# Altium footprint library CRD25DA12N-FMC.PcbLib: 132 footprints (part 2 of 9)
Each footprint in its own frame and in the unit in brackets; x right, y up, seen from the top. Pads: shape width x height; smd on the part's side, far side on the other; paste and mask are expansions set on the pad; w line width, h text height; cw(c..) or ccw(c..) is an arc to the next point about the centre after c.
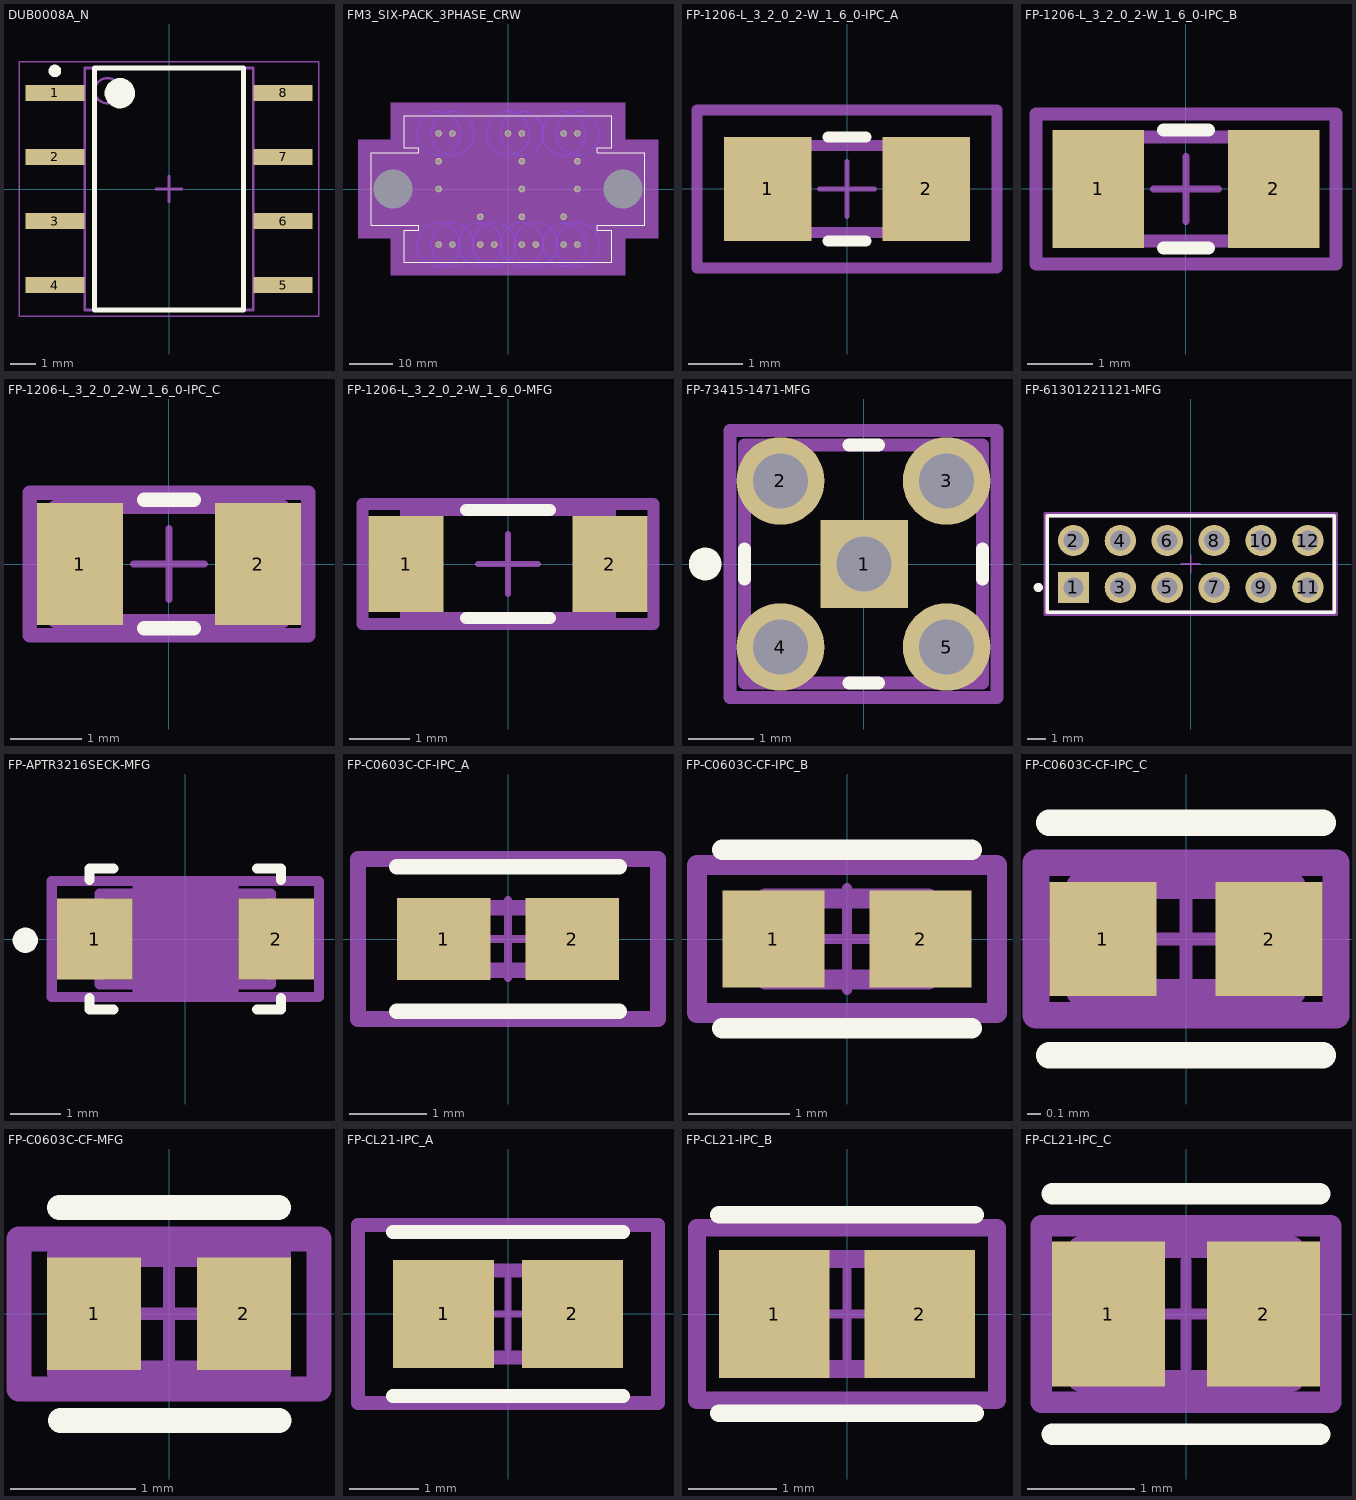
[diagram p1: the footprints below, top view; thin cyan lines are the x and y axes]

## DUB0008A_N [mm] "SOP, 8-Leads, Body 6.7x9.6mm, Pitch 2.54mm, IPC Medium Density"
height 4.85
pads (8):
  rrect15% 2.35x0.65 smd: 1(-4.525,3.81) 2(-4.525,1.27) 3(-4.525,-1.27) 4(-4.525,-3.81) 5(4.525,-3.81) 6(4.525,-1.27) 7(4.525,1.27) 8(4.525,3.81)
Top Overlay:
  circle w0.25: c-4.525,4.685 r0.125
  circle w0.6: c-1.95,3.8 r0.3
  lines w0.2: -2.95,-4.8 -2.95,4.8 2.95,4.8 2.95,-4.8 -2.95,-4.8
Mechanical 1:
  text ".Designator" at -2.54,-0.254 h1
Mechanical 13:
  circle w0.1: c-2.45,3.9 r0.5
  lines w0.1: -3.35,-4.8 -3.35,4.8 3.35,4.8 3.35,-4.8 -3.35,-4.8
Mechanical 15:
  lines w0.05: -5.95,-5.05 -5.95,5.05 5.95,5.05 5.95,-5.05 -5.95,-5.05
  lines w0.1: -0.5,0 0.5,0 ; 0,-0.5 0,0.5
3D body "DUB0008A.stp": height 4.85, standoff 0, extent -5.242,-4.75 5.242,4.75

## FM3_SIX-PACK_3PHASE_CRW [mm]
pads (25):
  round 1.524 hole 1.1: DC+_1(-6.4,-6.4) DC+_2(3.2,-6.4) DC+_3(12.8,-6.4) DC-1(-16,0) DC-2(3.2,0) DC-3(16,0) G1(-12.8,-12.8) G2(-16,12.8) G3(-3.2,-12.8) G4(3.2,12.8) G5(6.4,-12.8) G6(16,12.8) NTC1(12.8,-12.8) NTC2(16,-12.8) S1(-16,-12.8) S2(-12.8,12.8) S3(-6.4,-12.8) S4(0,12.8) S5(3.2,-12.8) S6(12.8,12.8) U(-16,6.4) V(3.2,6.4) W(16,6.4)
  round 0 hole 9 unplated: MH1(-26.5,0) MH2(26.5,0)
Bottom Layer keep-out:
  circle w0.254: c-16,12.8 r5
  circle w0.254: c-12.8,12.8 r5
  circle w0.254: c0,12.8 r5
  circle w0.254: c3.2,12.8 r5
  circle w0.254: c12.8,12.8 r5
  circle w0.254: c16,12.8 r5
  circle w0.254: c16,-12.8 r5
  circle w0.254: c12.997,-12.859 r5
  circle w0.254: c6.4,-12.8 r5
  circle w0.254: c3.2,-12.8 r5
  circle w0.254: c-3.2,-12.8 r5
  circle w0.254: c-6.4,-12.8 r5
  circle w0.254: c-12.8,-12.8 r5
  circle w0.254: c-16,-12.8 r5
Top Overlay:
  lines w0.152: -31.521,-8.331 -20.625,-8.331 -20.625,-9.563 -23.927,-9.563 -23.927,-16.878 23.927,-16.878 23.927,-9.563 20.625,-9.563 20.625,-8.331 31.521,-8.331 31.521,8.331 20.625,8.331 20.625,9.563 23.927,9.563 23.927,16.878 -23.927,16.878 -23.927,9.563 -20.625,9.563 -20.625,8.331 -31.521,8.331 -31.521,-8.331
Bottom Courtyard:
  text "Default Padstyle: EX60Y60D43P0" at -9.525,-21.831 h1.27
Bottom 3D Body:
  region: 26.975,19.926 -26.975,19.926 -26.975,11.379 -34.569,11.379 -34.569,-11.379 -26.975,-11.379 -26.975,-19.926 26.975,-19.926 26.975,-11.379 34.569,-11.379 34.569,11.379 26.975,11.379
Top Designator:
  text ".Designator" at 7.618,-0.694 h1.52
Mechanical 13:
  drawing of 27 lines, arcs and shapes, not listed
Mechanical 15:
  region: 20.752,-9.436 20.752,-8.458 31.648,-8.458 31.648,8.458 20.752,8.458 20.752,9.436 24.054,9.436 24.054,17.005 -24.054,17.005 -24.054,9.436 -20.752,9.436 -20.752,8.458 -31.648,8.458 -31.648,-8.458 -20.752,-8.458 -20.752,-9.436 -24.054,-9.436 -24.054,-17.005 24.054,-17.005 24.054,-9.436
  lines w0.152: -31.648,-8.458 -20.752,-8.458 -20.752,-9.436 -24.054,-9.436 -24.054,-17.005 24.054,-17.005 24.054,-9.436 20.752,-9.436 20.752,-8.458 31.648,-8.458 31.648,8.458 20.752,8.458 20.752,9.436 24.054,9.436 24.054,17.005 -24.054,17.005 -24.054,9.436 -20.752,9.436 -20.752,8.458 -31.648,8.458 -31.648,-8.458
3D body: height 0.25, standoff 0, extent 0,0 0.254,0.254
3D body "McMaster-Carr 93070A095 - Alternative.STEP": height -7.7, standoff -16.5, extent 23,-3.5 30,3.5
3D body "McMaster-Carr 93070A095 - Alternative.STEP": height -7.7, standoff -16.5, extent -30,-3.5 -23,3.5
3D body "CCB0xxM12FM3(Six_Pack)_External_POD_20200723_Branded_Origin.STEP": height 11.98, standoff -4.42, extent -31.4,-16.9 31.4,16.9

## FP-1206-L_3_2_0_2-W_1_6_0-IPC_A [mm]
pads (2):
  rect 1.604x1.906 smd paste+0 mask+0: 1(-1.451,0) 2(1.451,0)
Top Overlay:
  lines w0.2: -0.349,-0.953 0.349,-0.953 ; -0.349,0.953 0.349,0.953
Mechanical 5:
  lines w0.2: -2.753,-1.453 2.753,-1.453 2.753,1.453 -2.753,1.453 -2.753,-1.453
  text ".Designator" at 0,0.188 h1
Mechanical 13:
  lines w0.2: -1.6,-0.8 1.6,-0.8 1.6,0.8 -1.6,0.8 -1.6,-0.8
Mechanical 15:
  lines w0.2: -2.753,-1.453 2.753,-1.453 2.753,1.453 -2.753,1.453 -2.753,-1.453
Mechanical 16:
  lines w0.1: -0.5,0 0.5,0 ; 0,-0.5 0,0.5
3D body "Cap_Taiyo_Yuden_JMK316ABJ226KLHT_eec.STEP": height 0.25, standoff 0, extent -2.753,-1.453 2.753,1.453

## FP-1206-L_3_2_0_2-W_1_6_0-IPC_B [mm]
pads (2):
  rect 1.404x1.806 smd paste+0 mask+0: 1(-1.351,0) 2(1.351,0)
Top Overlay:
  lines w0.2: -0.349,-0.903 0.349,-0.903 ; -0.349,0.903 0.349,0.903
Mechanical 5:
  lines w0.2: -2.303,-1.153 2.303,-1.153 2.303,1.153 -2.303,1.153 -2.303,-1.153
  text ".Designator" at 0,0.188 h1
Mechanical 13:
  lines w0.2: -1.6,-0.8 1.6,-0.8 1.6,0.8 -1.6,0.8 -1.6,-0.8
Mechanical 15:
  lines w0.2: -2.303,-1.153 2.303,-1.153 2.303,1.153 -2.303,1.153 -2.303,-1.153
Mechanical 16:
  lines w0.1: -0.5,0 0.5,0 ; 0,-0.5 0,0.5
3D body "Cap_Taiyo_Yuden_JMK316ABJ226KLHT_eec.STEP": height 0.25, standoff 0, extent -2.303,-1.153 2.303,1.153

## FP-1206-L_3_2_0_2-W_1_6_0-IPC_C [mm]
pads (2):
  rect 1.204x1.706 smd paste+0 mask+0: 1(-1.251,0) 2(1.251,0)
Top Overlay:
  lines w0.2: -0.349,-0.9 0.349,-0.9 ; -0.349,0.9 0.349,0.9
Mechanical 5:
  lines w0.2: -1.953,-1 1.953,-1 1.953,1 -1.953,1 -1.953,-1
  text ".Designator" at 0,0.188 h1
Mechanical 13:
  lines w0.2: -1.6,-0.8 1.6,-0.8 1.6,0.8 -1.6,0.8 -1.6,-0.8
Mechanical 15:
  lines w0.2: -1.953,-1 1.953,-1 1.953,1 -1.953,1 -1.953,-1
Mechanical 16:
  lines w0.1: -0.5,0 0.5,0 ; 0,-0.5 0,0.5
3D body "Cap_Taiyo_Yuden_JMK316ABJ226KLHT_eec.STEP": height 0.25, standoff 0, extent -1.953,-1 1.953,1

## FP-1206-L_3_2_0_2-W_1_6_0-MFG [mm]
pads (2):
  rect 1.25x1.6 smd paste+0 mask+0: 1(-1.7,0) 2(1.7,0)
Top Overlay:
  lines w0.2: -0.7,-0.9 0.7,-0.9 ; -0.7,0.9 0.7,0.9
Mechanical 5:
  lines w0.2: -2.425,-1 -2.425,1 2.425,1 2.425,-1 -2.425,-1
  text ".Designator" at 0,0.188 h1
Mechanical 13:
  lines w0.2: -1.7,-0.9 -1.7,0.9 1.7,0.9 1.7,-0.9 -1.7,-0.9
Mechanical 15:
  lines w0.2: -2.425,-1 -2.425,1 2.425,1 2.425,-1 -2.425,-1
Mechanical 16:
  lines w0.1: -0.5,0 0.5,0 ; 0,-0.5 0,0.5
3D body "Cap_Taiyo_Yuden_JMK316ABJ226KLHT_eec.STEP": height 0.25, standoff 0, extent -2.425,-1 2.425,1

## FP-73415-1471-MFG [mm]
pads (5):
  rect 1.34x1.34 hole 0.84 paste-1000 mask+0: 1(0.01,0)
  round 1.34 hole 0.84 paste-1000 mask+0: 2(-1.27,1.27) 3(1.27,1.27) 4(-1.27,-1.27) 5(1.27,-1.27)
Top Overlay:
  circle w0.25: c-2.42,0 r0.125
  lines w0.2: -1.82,-0.225 -1.82,0.225 ; -0.225,-1.82 0.225,-1.82 ; -0.225,1.82 0.225,1.82 ; 1.82,-0.225 1.82,0.225
Mechanical 5:
  lines w0.2: -2.04,-2.04 -2.04,2.04 2.04,2.04 2.04,-2.04 -2.04,-2.04
  text ".Designator" at 0,0.188 h1
Mechanical 13:
  lines w0.2: -1.82,-1.82 -1.82,1.82 1.82,1.82 1.82,-1.82 -1.82,-1.82
Mechanical 15:
  lines w0.2: -2.04,-2.04 -2.04,2.04 2.04,2.04 2.04,-2.04 -2.04,-2.04
Mechanical 16:
  lines w0.1: -0.5,0 0.5,0 ; 0,-0.5 0,0.5
3D body "Conn_Molex_73415-1471_eec.STEP": height 0.25, standoff 0, extent -2.04,-2.04 2.04,2.04

## FP-61301221121-MFG [mm]
pads (12):
  rect 1.7x1.7 hole 1.1 paste-1000 mask+0: 1(-6.35,-1.27)
  round 1.7 hole 1.1 paste-1000 mask+0: 2(-6.35,1.27) 3(-3.81,-1.27) 4(-3.81,1.27) 5(-1.27,-1.27) 6(-1.27,1.27) 7(1.27,-1.27) 8(1.27,1.27) 9(3.81,-1.27) 10(3.81,1.27) 11(6.35,-1.27) 12(6.35,1.27)
Top Overlay:
  circle w0.25: c-8.255,-1.27 r0.125
  lines w0.2: -7.77,-2.615 7.77,-2.615 7.77,2.615 -7.77,2.615 -7.77,-2.615
Mechanical 5:
  lines w0.2: -7.87,-2.715 7.87,-2.715 7.87,2.715 -7.87,2.715 -7.87,-2.715
  text ".Designator" at 0,0.188 h1
Mechanical 13:
  lines w0.2: -7.77,-2.615 7.77,-2.615 7.77,2.615 -7.77,2.615 -7.77,-2.615
Mechanical 15:
  lines w0.2: -7.87,-2.715 7.87,-2.715 7.87,2.715 -7.87,2.715 -7.87,-2.715
Mechanical 16:
  lines w0.1: -0.5,0 0.5,0 ; 0,-0.5 0,0.5
3D body "Conn_Wurth_Electronics_61301221121_eec.STEP": height 0.25, standoff 0, extent -7.87,-2.715 7.87,2.715

## FP-APTR3216SECK-MFG [mm]
pads (2):
  rect 1.5x1.6 smd paste+0 mask+0: 1(-1.8,0) 2(1.8,0)
Top Overlay:
  circle w0.25: c-3.175,-0.025 r0.125
  lines w0.2: -1.9,-1.175 -1.9,-1.4 -1.425,-1.4 ; -1.9,1.175 -1.9,1.4 -1.425,1.4 ; 1.425,-1.4 1.9,-1.4 1.9,-1.175 ; 1.425,1.4 1.9,1.4 1.9,1.175
Bottom 3D Body:
  rectangle: -1.05,-1.15 1.05,1.15
Mechanical 5:
  lines w0.2: -2.65,-1.15 -2.65,1.15 2.65,1.15 2.65,-1.15 -2.65,-1.15
  text ".Designator" at 0,0 h1
Mechanical 13:
  lines w0.2: -1.7,-0.9 -1.7,0.9 1.7,0.9 1.7,-0.9 -1.7,-0.9
Mechanical 15:
  lines w0.2: -2.65,-1.15 -2.65,1.15 2.65,1.15 2.65,-1.15 -2.65,-1.15
Mechanical 16:
  lines w0.1: -0.5,0 0.5,0 ; 0,-0.5 0,0.5
3D body "LED 1206 - PURPLE.STEP": height 1.1, standoff 0, extent -1.6,-0.8 1.6,0.802

## FP-C0603C-CF-IPC_A [mil]
pads (2):
  rect 47.5x41.66 smd paste+0 mask+0: 1(-32.51,0) 2(32.51,0)
Top Overlay:
  lines w7.87: -56.26,-36.58 56.26,-36.58 ; -56.26,36.58 56.26,36.58
Mechanical 5:
  lines w7.87: -75.95,-40.52 -75.95,40.52 75.95,40.52 75.95,-40.52 -75.95,-40.52
  text ".Designator" at 0,7.4 h39.37
Mechanical 13:
  lines w7.87: -31.5,-15.75 -31.5,15.75 31.5,15.75 31.5,-15.75 -31.5,-15.75
Mechanical 15:
  lines w7.87: -75.95,-40.52 -75.95,40.52 75.95,40.52 75.95,-40.52 -75.95,-40.52
Mechanical 16:
  lines w3.94: -19.68,0 19.68,0 ; 0,-19.68 0,19.68
3D body "Cap_KEMET_C0603C272M5JACTU_eec.STEP": height 10, standoff 0, extent -75.95,-40.52 75.95,40.52

## FP-C0603C-CF-IPC_B [mm]
pads (2):
  rect 1.007x0.958 smd paste+0 mask+0: 1(-0.726,0) 2(0.726,0)
Top Overlay:
  lines w0.2: -1.229,-0.879 1.229,-0.879 ; -1.229,0.879 1.229,0.879
Mechanical 5:
  lines w0.2: -1.479,-0.729 -1.479,0.729 1.479,0.729 1.479,-0.729 -1.479,-0.729
  text ".Designator" at 0,0.188 h1
Mechanical 13:
  lines w0.2: -0.8,-0.4 -0.8,0.4 0.8,0.4 0.8,-0.4 -0.8,-0.4
Mechanical 15:
  lines w0.2: -1.479,-0.729 -1.479,0.729 1.479,0.729 1.479,-0.729 -1.479,-0.729
Mechanical 16:
  lines w0.1: -0.5,0 0.5,0 ; 0,-0.5 0,0.5
3D body "Cap_KEMET_C0603C272M5JACTU_eec.STEP": height 0.25, standoff 0, extent -1.479,-0.729 1.479,0.729

## FP-C0603C-CF-IPC_C [mm]
pads (2):
  rect 0.807x0.858 smd paste+0 mask+0: 1(-0.626,0) 2(0.626,0)
Top Overlay:
  lines w0.2: -1.029,-0.875 1.029,-0.875 ; -1.029,0.875 1.029,0.875
Mechanical 5:
  lines w0.2: -1.129,-0.575 1.129,-0.575 1.129,0.575 -1.129,0.575 -1.129,-0.575
  text ".Designator" at 0,0.188 h1
Mechanical 13:
  lines w0.2: -0.8,-0.4 0.8,-0.4 0.8,0.4 -0.8,0.4 -0.8,-0.4
Mechanical 15:
  lines w0.2: -1.129,-0.575 1.129,-0.575 1.129,0.575 -1.129,0.575 -1.129,-0.575
Mechanical 16:
  lines w0.1: -0.5,0 0.5,0 ; 0,-0.5 0,0.5
3D body "Cap_KEMET_C0603C272M5JACTU_eec.STEP": height 0.25, standoff 0, extent -1.129,-0.575 1.129,0.575

## FP-C0603C-CF-MFG [mm]
pads (2):
  rect 0.75x0.9 smd paste+0 mask+0: 1(-0.6,0) 2(0.6,0)
Top Overlay:
  lines w0.2: -0.875,0.85 0.875,0.85 ; -0.87,-0.853 0.88,-0.853
Mechanical 5:
  lines w0.2: -1.2,-0.6 1.2,-0.6 1.2,0.6 -1.2,0.6 -1.2,-0.6
  text ".Designator" at 0,0.188 h1
Mechanical 13:
  lines w0.2: -0.875,-0.475 0.875,-0.475 0.875,0.475 -0.875,0.475 -0.875,-0.475
Mechanical 15:
  lines w0.2: -1.2,-0.6 1.2,-0.6 1.2,0.6 -1.2,0.6 -1.2,-0.6
Mechanical 16:
  lines w0.1: -0.5,0 0.5,0 ; 0,-0.5 0,0.5
3D body "Cap_KEMET_C0603C272M5JACTU_eec.STEP": height 0.25, standoff 0, extent -1.2,-0.6 1.2,0.6

## FP-CL21-IPC_A [mm]
pads (2):
  rect 1.455x1.556 smd paste+0 mask+0: 1(-0.926,0) 2(0.926,0)
Top Overlay:
  lines w0.2: -1.653,-1.178 1.653,-1.178 ; -1.653,1.178 1.653,1.178
Mechanical 5:
  lines w0.2: -2.153,-1.278 -2.153,1.278 2.153,1.278 2.153,-1.278 -2.153,-1.278
  text ".Designator" at 0,0.188 h1
Mechanical 13:
  lines w0.2: -1,-0.625 -1,0.625 1,0.625 1,-0.625 -1,-0.625
Mechanical 15:
  lines w0.2: -2.153,-1.278 -2.153,1.278 2.153,1.278 2.153,-1.278 -2.153,-1.278
Mechanical 16:
  lines w0.1: -0.5,0 0.5,0 ; 0,-0.5 0,0.5
3D body "Cap_Samsung_CL21B273KBANNNC_eec.STEP": height 0.25, standoff 0, extent -2.153,-1.278 2.153,1.278

## FP-CL21-IPC_B [mm]
pads (2):
  rect 1.255x1.456 smd paste+0 mask+0: 1(-0.826,0) 2(0.826,0)
Top Overlay:
  lines w0.2: -1.453,-1.128 1.453,-1.128 ; -1.453,1.128 1.453,1.128
Mechanical 5:
  lines w0.2: -1.703,-0.978 -1.703,0.978 1.703,0.978 1.703,-0.978 -1.703,-0.978
  text ".Designator" at 0,0.188 h1
Mechanical 13:
  lines w0.2: -1,-0.625 -1,0.625 1,0.625 1,-0.625 -1,-0.625
Mechanical 15:
  lines w0.2: -1.703,-0.978 -1.703,0.978 1.703,0.978 1.703,-0.978 -1.703,-0.978
Mechanical 16:
  lines w0.1: -0.5,0 0.5,0 ; 0,-0.5 0,0.5
3D body "Cap_Samsung_CL21B273KBANNNC_eec.STEP": height 0.25, standoff 0, extent -1.703,-0.978 1.703,0.978

## FP-CL21-IPC_C [mm]
pads (2):
  rect 1.055x1.356 smd paste+0 mask+0: 1(-0.726,0) 2(0.726,0)
Top Overlay:
  lines w0.2: -1.253,-1.125 1.253,-1.125 ; -1.253,1.125 1.253,1.125
Mechanical 5:
  lines w0.2: -1.353,-0.825 -1.353,0.825 1.353,0.825 1.353,-0.825 -1.353,-0.825
  text ".Designator" at 0,0.188 h1
Mechanical 13:
  lines w0.2: -1,-0.625 -1,0.625 1,0.625 1,-0.625 -1,-0.625
Mechanical 15:
  lines w0.2: -1.353,-0.825 -1.353,0.825 1.353,0.825 1.353,-0.825 -1.353,-0.825
Mechanical 16:
  lines w0.1: -0.5,0 0.5,0 ; 0,-0.5 0,0.5
3D body "Cap_Samsung_CL21B273KBANNNC_eec.STEP": height 0.25, standoff 0, extent -1.353,-0.825 1.353,0.825